# Altium footprint library My Footprint 3D.PCBLIB: 447 footprints (part 4 of 29)
Each footprint in its own frame and in the unit in brackets; x right, y up, seen from the top. Pads: shape width x height; smd on the part's side, far side on the other; paste and mask are expansions set on the pad; w line width, h text height; cw(c..) or ccw(c..) is an arc to the next point about the centre after c.
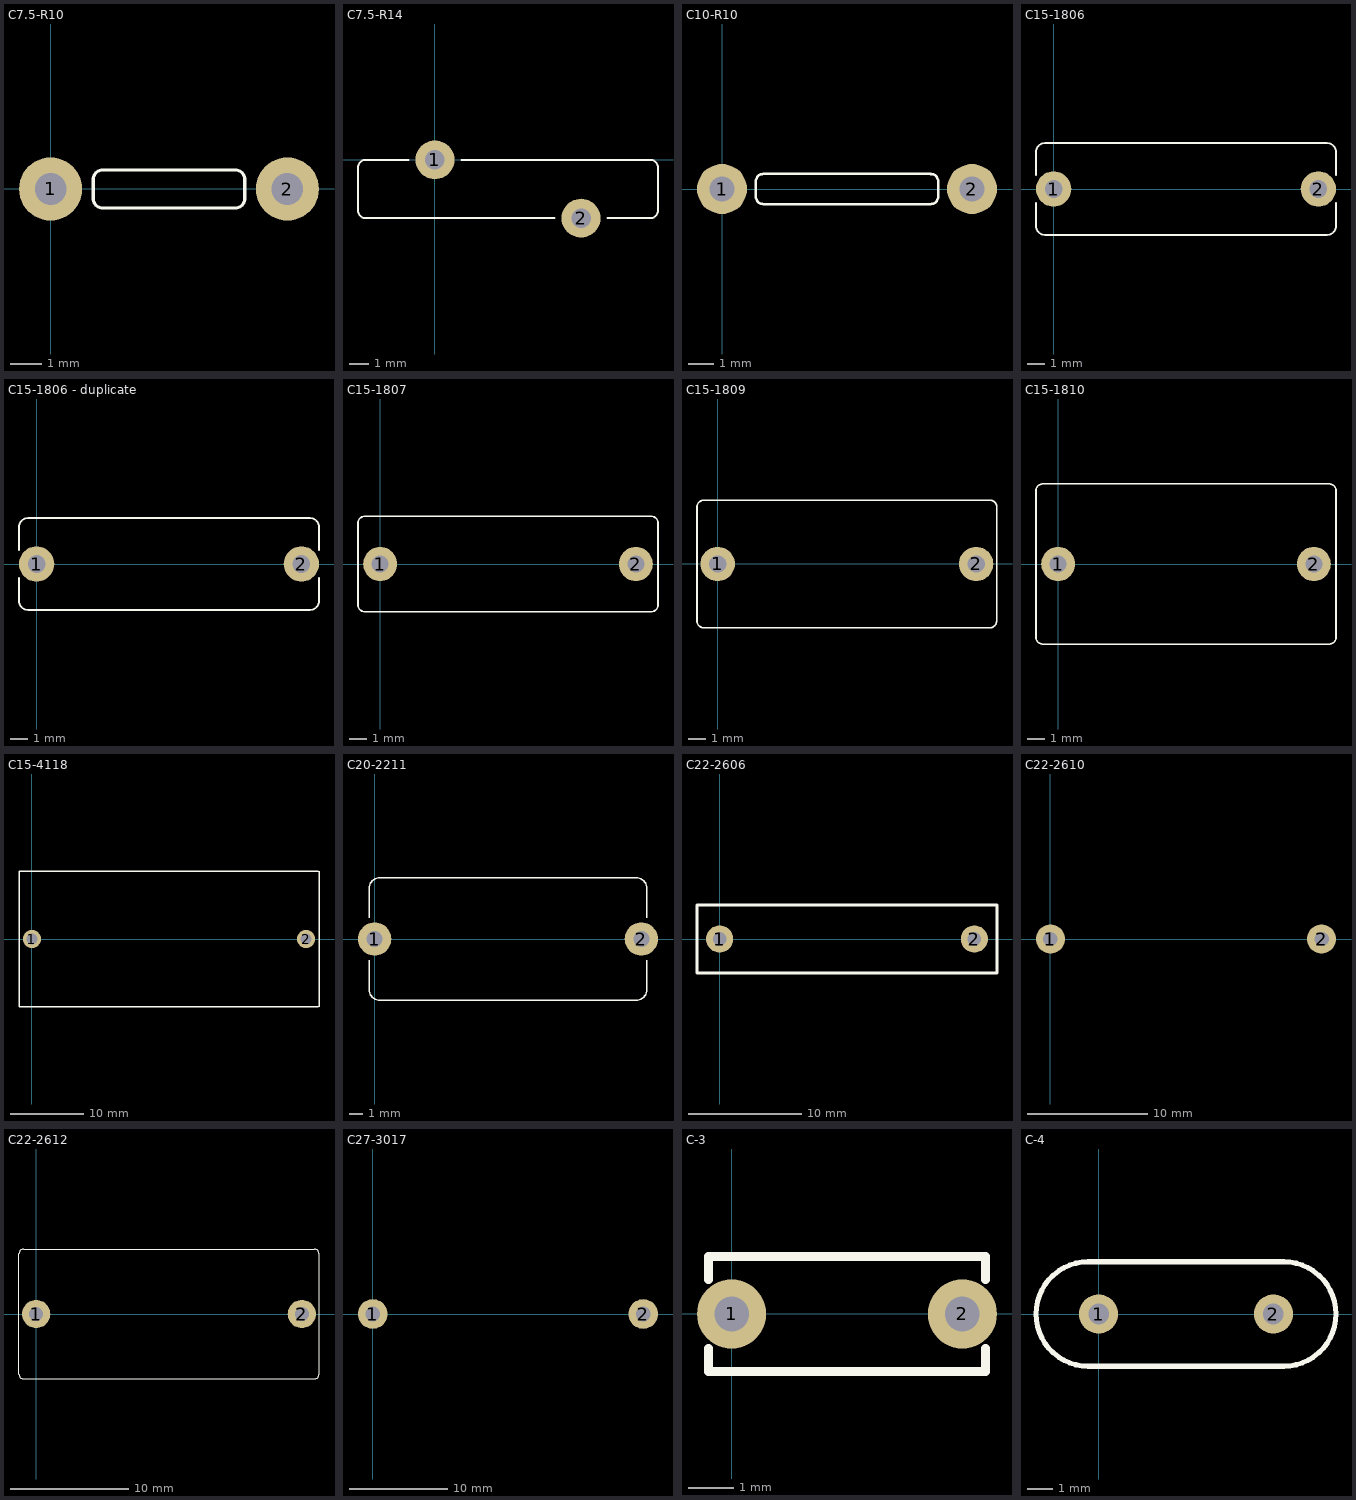
[diagram p3: the footprints below, top view; thin cyan lines are the x and y axes]

## C7.5-R10 [mm]
pads (2):
  round 2 hole 1: 1(0,0) 2(7.5,0)
Top Overlay:
  lines w0.1: 1.65,-0.6 ccw(c1.65,-0.6) 1.65,-0.6 ; 1.65,-0.6 5.85,-0.6 ccw(c5.85,-0.3) 6.15,-0.3 6.15,0.3 ccw(c5.85,0.3) 5.85,0.6 ; 1.65,-0.6 1.65,-0.6 cw(c1.65,-0.3) 1.35,-0.3 1.35,0.3 cw(c1.65,0.3) 1.65,0.6 5.85,0.6 ; 5.85,0.6 ccw(c5.85,0.6) 5.85,0.6
3D body: height 12.99, standoff 3.01, extent -1.352,-1.865 8.805,1.834
3D body: height 5.43, standoff 0.5, extent -0.595,-0.599 2.941,0.599
3D body: height 1, standoff -2, extent -0.298,-0.299 0.3,0.3
3D body: height 1.2, standoff 0.4, extent -0.595,-0.599 0.6,0.599
3D body: height 1.2, standoff 0.4, extent 6.9,-0.599 8.095,0.599
3D body: height 1, standoff -2, extent 7.2,-0.299 7.798,0.299
3D body: height 5.43, standoff 0.5, extent 4.559,-0.599 8.095,0.599

## C7.5-R14 [mm]
pads (2):
  round 2 hole 1: 1(0,0) 2(7.5,-3)
Top Overlay:
  lines w0.1: -3.6,-3 6.15,-3 ; -3.55,-3 cw(c-3.55,-2.6) -3.95,-2.6 -3.95,-0.4 cw(c-3.55,-0.4) -3.55,0 -1.35,0 ; 1.35,0 11.1,0 ; 8.85,-3 11.05,-3 ccw(c11.05,-2.6) 11.45,-2.6 11.45,-0.4 ccw(c11.05,-0.4) 11.05,0
3D body: height 18.28, standoff 1.72, extent -4.517,-3.5 12.017,0.5
3D body: height 5.43, standoff 0.5, extent -0.595,-0.599 2.941,0.599
3D body: height 1, standoff -2, extent -0.298,-0.299 0.3,0.3
3D body: height 1.2, standoff 0.4, extent -0.595,-0.599 0.6,0.599
3D body: height 1.2, standoff 0.4, extent 6.9,-3.599 8.095,-2.401
3D body: height 1, standoff -2, extent 7.2,-3.3 7.798,-2.701
3D body: height 5.43, standoff 0.5, extent 4.559,-3.599 8.095,-2.401

## C10-R10 [mm]
pads (2):
  round 2 hole 1: 1(0,0) 2(10,0)
Top Overlay:
  lines w0.1: 1.65,-0.6 ccw(c1.65,-0.6) 1.65,-0.6 ; 1.65,-0.6 ccw(c1.65,-0.6) 1.65,-0.6 ; 1.65,-0.6 1.65,-0.6 ; 1.65,-0.6 cw(c1.65,-0.3) 1.35,-0.3 1.35,0.3 cw(c1.65,0.3) 1.65,0.6 8.35,0.6 ; 1.65,-0.6 8.35,-0.6 ccw(c8.35,-0.3) 8.65,-0.3 8.65,0.3 ccw(c8.35,0.3) 8.35,0.6 ; 8.35,0.6 ccw(c8.35,0.6) 8.35,0.6 ; 8.35,0.6 8.35,0.6 ; 8.35,0.6 ccw(c8.35,0.6) 8.35,0.6
3D body: height 1.2, standoff 0.4, extent -0.595,-0.599 0.6,0.599
3D body: height 1, standoff -2, extent -0.298,-0.299 0.3,0.3
3D body: height 5.43, standoff 0.5, extent -0.595,-0.599 2.941,0.599
3D body: height 12.99, standoff 3.01, extent -0.257,-2.849 10.247,2.82
3D body: height 5.43, standoff 0.5, extent 7.059,-0.599 10.595,0.599
3D body: height 1, standoff -2, extent 9.7,-0.3 10.298,0.299
3D body: height 1.2, standoff 0.4, extent 9.4,-0.599 10.595,0.599

## C15-1806 [mm]
pads (2):
  round 2 hole 1: 1(0,0) 2(15,0)
Top Overlay:
  lines w0.1: -1,-0.8 -1,-2.1 ccw(c-0.5,-2.1) -0.5,-2.6 15.5,-2.6 ccw(c15.5,-2.1) 16,-2.1 16,-0.8 ; -1,0.8 -1,2.1 cw(c-0.5,2.1) -0.5,2.6 15.5,2.6 cw(c15.5,2.1) 16,2.1 16,0.8
3D body: height 0.3, standoff 0, extent 12,2.7 15,3
3D body: height 0.3, standoff 0, extent 0.01,2.7 3.01,3
3D body: height 0.3, standoff 0, extent 11.99,-3 14.99,-2.7
3D body: height 0.3, standoff 0, extent 0,-3 3,-2.7
3D body: height 0, standoff -2, extent 14.594,-0.399 15.391,0.399
3D body: height 0, standoff -2, extent -0.406,-0.399 0.39,0.399
3D body: height 11, standoff 0.3, extent -1.5,-3 16.5,3

## C15-1806 - duplicate [mm]
pads (2):
  round 2 hole 1: 1(0,0) 2(15,0)
Top Overlay:
  lines w0.1: -1,-0.8 -1,-2.1 ccw(c-0.5,-2.1) -0.5,-2.6 15.5,-2.6 ccw(c15.5,-2.1) 16,-2.1 16,-0.8 ; -1,0.8 -1,2.1 cw(c-0.5,2.1) -0.5,2.6 15.5,2.6 cw(c15.5,2.1) 16,2.1 16,0.8
3D body: height 11, standoff 0.3, extent -1.5,-3 16.5,3
3D body: height 0, standoff -2, extent -0.406,-0.399 0.39,0.399
3D body: height 0, standoff -2, extent 14.594,-0.399 15.391,0.399
3D body: height 0.3, standoff 0, extent 0,-3 3,-2.7
3D body: height 0.3, standoff 0, extent 11.99,-3 14.99,-2.7
3D body: height 0.3, standoff 0, extent 0.01,2.7 3.01,3
3D body: height 0.3, standoff 0, extent 12,2.7 15,3

## C15-1807 [mm]
pads (2):
  round 2 hole 1: 1(0,0) 2(15,0)
Top Overlay:
  lines w0.1: -1.3,-2.4 ccw(c-0.9,-2.4) -0.9,-2.8 15.9,-2.8 ccw(c15.9,-2.4) 16.3,-2.4 16.3,2.4 ccw(c15.9,2.4) 15.9,2.8 -0.9,2.8 ccw(c-0.9,2.4) -1.3,2.4 -1.3,-2.4
3D body: height 10.5, standoff 3.5, extent -1.5,-3.486 16.5,3.486
3D body: height 13.99, standoff 7.01, extent -1.5,-3.486 16.5,3.486
3D body: height 6.99, standoff 0.01, extent -1.5,-3.486 16.5,3.486
3D body: height 0, standoff -2, extent -0.406,-0.399 0.39,0.399
3D body: height 0, standoff -2, extent 14.594,-0.399 15.391,0.399

## C15-1809 [mm]
pads (2):
  round 2 hole 1: 1(0,0) 2(15,0)
Top Overlay:
  lines w0.1: 15.79,-3.7 cw(c15.79,-3.7) 15.79,-3.7 15.79,-3.7 ; 15.79,-3.7 ccw(c15.79,-3.3) 16.19,-3.3 16.19,3.29 cw(c16.2,3.29) 16.2,3.3 ccw(c15.8,3.3) 15.8,3.7 -0.8,3.7 ccw(c-0.8,3.3) -1.2,3.3 -1.2,-3.3 ccw(c-0.8,-3.3) -0.8,-3.7 15.79,-3.7
3D body: height 0, standoff -2, extent 14.594,-0.399 15.391,0.399
3D body: height 0, standoff -2, extent -0.406,-0.399 0.39,0.399
3D body: height 8.99, standoff 0.01, extent -1.5,-4.5 16.5,4.465
3D body: height 14.99, standoff 6.01, extent -1.5,-4.5 16.5,4.465
3D body: height 10.5, standoff 4.5, extent -1.5,-4.5 16.5,4.465

## C15-1810 [mm]
pads (2):
  round 2 hole 1: 1(0,0) 2(15,0)
Top Overlay:
  lines w0.1: -1.3,-4.3 ccw(c-0.9,-4.3) -0.9,-4.7 15.9,-4.7 ccw(c15.9,-4.3) 16.3,-4.3 16.3,4.3 ccw(c15.9,4.3) 15.9,4.7 -0.9,4.7 ccw(c-0.9,4.3) -1.3,4.3 -1.3,-4.3
3D body: height 0, standoff -2, extent 14.594,-0.399 15.391,0.399
3D body: height 0, standoff -2, extent -0.406,-0.399 0.39,0.399
3D body: height 0.4, standoff 0, extent -0.3,-5 2.7,-4.8
3D body: height 0.4, standoff 0, extent 12.3,-5 15.3,-4.8
3D body: height 0.4, standoff 0, extent -0.3,4.8 2.7,5
3D body: height 0.4, standoff 0, extent 12.3,4.8 15.3,5
3D body: height 16, standoff 0.4, extent -1.5,-5 16.5,5

## C15-4118 [mm] "Body 41X18.5mm"
pads (2):
  round 2.5 hole 1.5: 1(0,0) 2(37.592,0)
Top Overlay:
  lines w0.2: 39.243,-9.271 -1.778,-9.271 -1.778,9.271 39.243,9.271 ; 39.37,-9.271 39.37,9.271

## C20-2211 [mm] "Body:22mmX10mm,Distance:20mm"
height 19
pads (2):
  round 2.5 hole 1.2: 1(0,0) 2(20,0)
Top Overlay:
  lines w0.1: -0.4,-1.6 -0.4,-3.8 ccw(c0.4,-3.8) 0.4,-4.6 19.6,-4.6 ccw(c19.6,-3.8) 20.4,-3.8 20.4,-1.6 ; -0.4,1.6 -0.4,3.8 cw(c0.4,3.8) 0.4,4.6 19.6,4.6 cw(c19.6,3.8) 20.4,3.8 20.4,1.6
3D body: height 0.5, standoff -1.5, extent 19.594,-0.399 20.39,0.399
3D body: height 0.5, standoff -1.5, extent -0.406,-0.399 0.39,0.399
3D body: height 14.5, standoff 5.5, extent -1.251,-5.519 21.249,5.437
3D body: height 10.99, standoff 0.01, extent -1.251,-5.519 21.249,5.437
3D body: height 19.99, standoff 9.01, extent -1.251,-5.519 21.249,5.437

## C22-2606 [mm] "26mmX6mm"
height 15
pads (2):
  round 2.4 hole 1.2: 1(0,0) 2(22.5,0)
Top Overlay:
  lines w0.254: -2,-3 24.5,-3 24.5,3 -2,3 -2,-3

## C22-2610 [mm]
pads (2):
  round 2.4 hole 1.2: 1(0,0) 2(22.5,0)
3D body: height 19, standoff 0, extent -1.75,-5 24.25,5
3D body: height 0.5, standoff -1.5, extent -0.406,-0.399 0.39,0.399
3D body: height 0.5, standoff -1.5, extent 22.094,-0.399 22.89,0.399

## C22-2612 [mm]
pads (2):
  round 2.4 hole 1.2: 1(0,0) 2(22.5,0)
Top Overlay:
  lines w0.1: -1.45,-5.1 ccw(c-1.05,-5.1) -1.05,-5.5 11.25,-5.5 23.55,-5.5 ccw(c23.55,-5.1) 23.95,-5.1 23.95,0 23.95,5.1 ccw(c23.55,5.1) 23.55,5.5 11.25,5.5 -1.05,5.5 ccw(c-1.05,5.1) -1.45,5.1 -1.45,0 -1.45,-5.1
3D body: height 0.7, standoff 0, extent 17.25,-6 24.456,6
3D body: height 0.7, standoff 0, extent -1.956,-6 5.25,6
3D body: height 22, standoff 0.7, extent -1.95,-6 24.45,6
3D body: height 0.5, standoff -1.5, extent 22.094,-0.399 22.89,0.399
3D body: height 0.5, standoff -1.5, extent -0.406,-0.399 0.391,0.399

## C27-3017 [mm]
pads (2):
  round 3 hole 1.5: 1(0,0) 2(27.5,0)
3D body: height 16.7, standoff 8.3, extent -0.75,-8.267 28.25,8.267
3D body: height 16.58, standoff 0.02, extent -0.75,-8.267 28.25,8.267
3D body: height 24.98, standoff 8.42, extent -0.75,-8.267 28.25,8.267
3D body: height 0, standoff -2, extent -0.406,-0.399 0.39,0.399
3D body: height 0, standoff -2, extent 27.094,-0.399 27.89,0.399

## C-3 [mil]
height 196.85
pads (2):
  round 60 hole 30: 1(0,0) 2(200,0)
Top Overlay:
  lines w7.87: -20,-30 -20,-50 220,-50 220,-30 ; -20,30 -20,50 220,50 220,30

## C-4 [mil]
pads (2):
  round 60 hole 31.5: 1(0,0) 2(268.5,0)
Top Overlay:
  lines w7.87: -15.75,-80.25 cw(c-15.75,0) -15.75,80.25 284.25,80.25 cw(c284.25,0) 284.25,-80.25 -15.75,-80.25